# Altium footprint library Vowstar_Basic_Device.PcbLib: 170 footprints (part 4 of 11)
Each footprint in its own frame and in the unit in brackets; x right, y up, seen from the top. Pads: shape width x height; smd on the part's side, far side on the other; paste and mask are expansions set on the pad; w line width, h text height; cw(c..) or ccw(c..) is an arc to the next point about the centre after c.
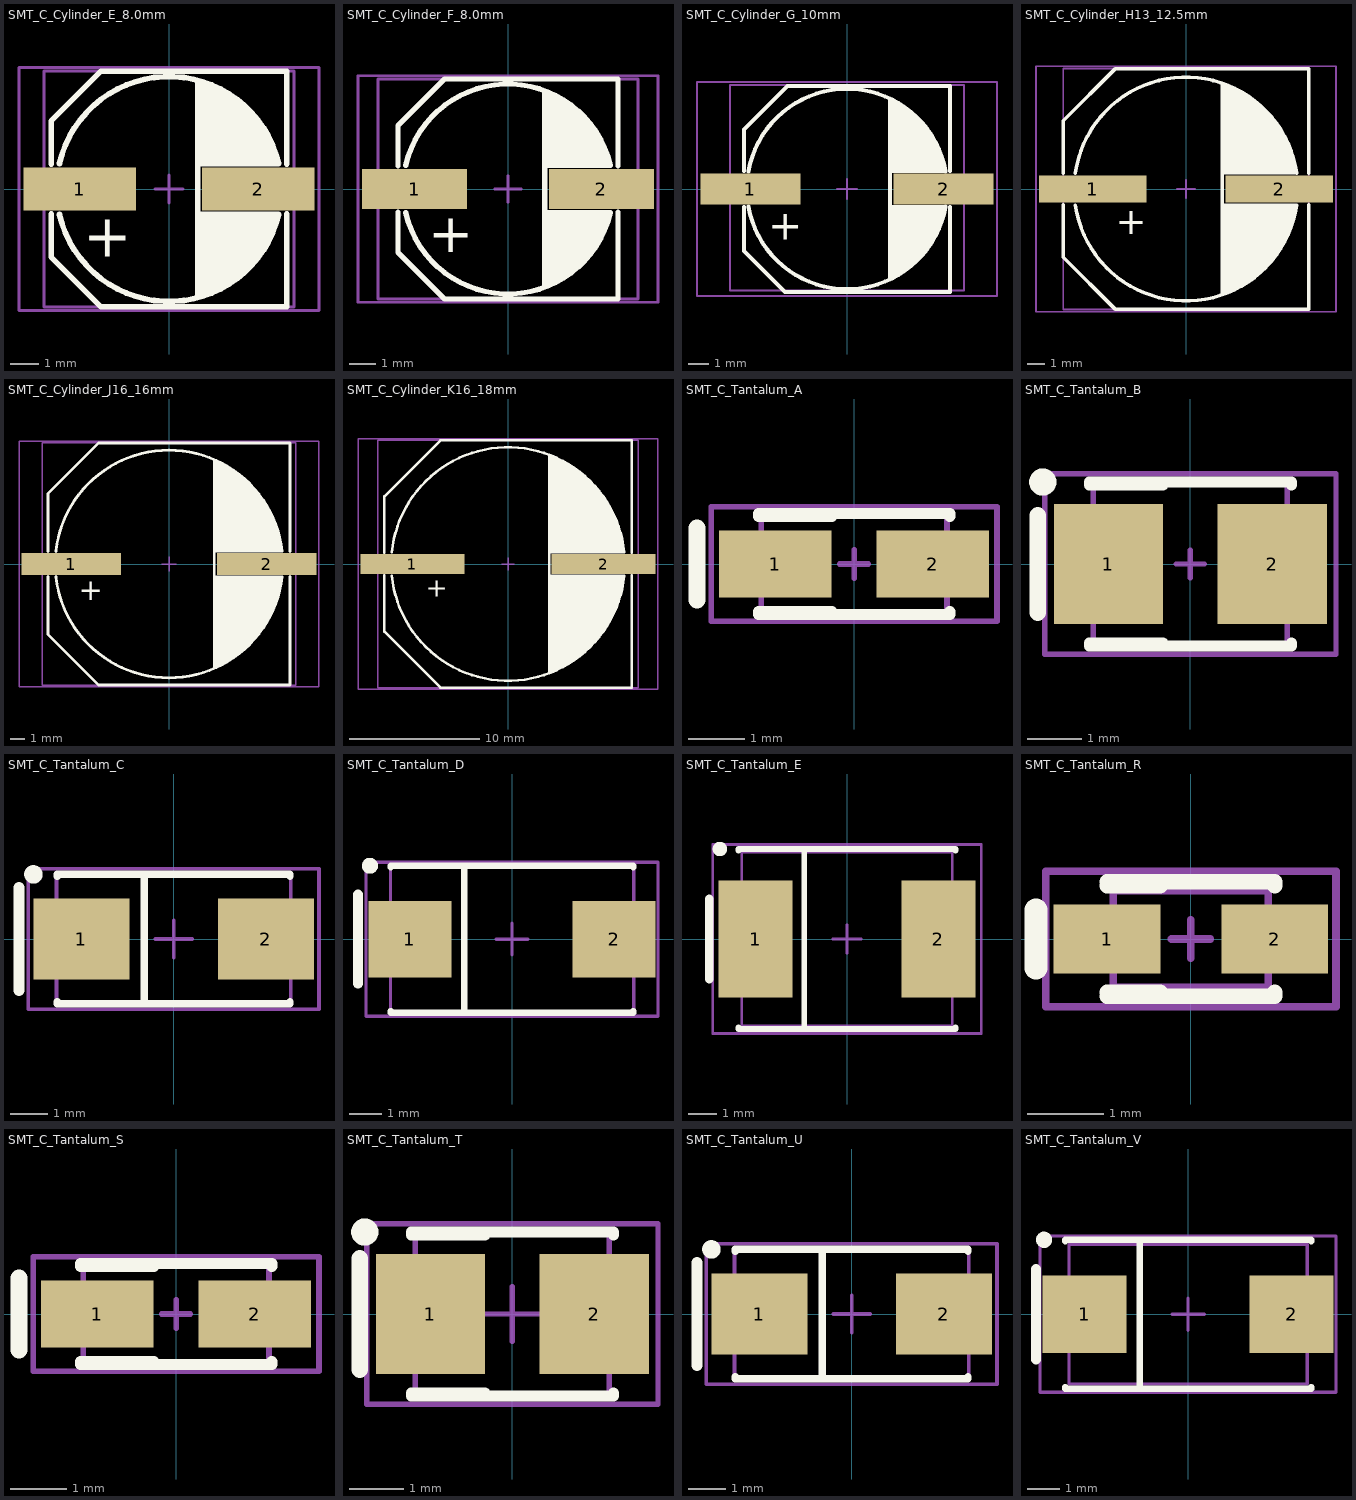
[diagram p3: the footprints below, top view; thin cyan lines are the x and y axes]

## SMT_C_Cylinder_E_8.0mm [mm] "Surface mount cylindrical capacitor type E 8.0mm"
height 6.2
pads (2):
  rect 4x1.524 smd: 1(-3.175,0) 2(3.175,0)
Top Overlay:
  region: 1.016,-0.813 3.912,-0.813 3.632,-1.702 2.921,-2.718 2.032,-3.454 1.194,-3.785 1.016,-3.81
  region: 1.016,0.813 3.912,0.813 3.632,1.702 2.921,2.718 2.032,3.454 1.194,3.785 1.016,3.81
  lines w0.2: -4.191,-0.889 -4.191,-2.413 -2.413,-4.191 4.191,-4.191 4.191,-0.889 ; -4.191,0.889 -4.191,2.413 -2.413,4.191 4.191,4.191 4.191,0.889 ; -3.895,-0.909 ccw(c0,0) 3.895,-0.909 ; -3.895,0.909 cw(c0,0) 3.895,0.909 ; 1.016,-3.81 1.016,3.81
  text "+" at -3.048,-2.413 h1.5
Mechanical 13:
  lines w0.1: -4.445,-4.191 4.445,-4.191 4.445,4.191 -4.445,4.191 -4.445,-4.191
Mechanical 15:
  lines w0.1: -0.5,0 0.5,0 ; 0,-0.5 0,0.5 ; -5.334,-4.318 5.334,-4.318 5.334,4.318 -5.334,4.318 -5.334,-4.318
3D body "User Library-capacitor size E.step": height 6.2, standoff -0.01, extent -4.5,-4.15 4.5,4.15

## SMT_C_Cylinder_F_8.0mm [mil] "Surface mount cylindrical capacitor type F 8.0mm"
height 401.57
pads (2):
  rect 157.48x60 smd: 1(-140,0) 2(140,0)
Top Overlay:
  region: 55,32 154,32 143,67 115,107 80,136 65,144 55,148
  region: 55,-32 154,-32 143,-67 115,-107 80,-136 65,-144 55,-147
  lines w7.87: -165,-35 -165,-95 -95,-165 165,-165 165,-35 ; -165,35 -165,95 -95,165 165,165 165,35 ; -153.36,-35.78 ccw(c0,0) 153.36,-35.78 ; -153.36,35.78 cw(c0,0) 153.36,35.78 ; 55,-145 55,145
  text "+" at -120,-95 h59.06
Mechanical 13:
  lines w3.94: -195,-165 -195,165 195,165 195,-165 -195,-165
Mechanical 15:
  lines w3.94: -19.69,0 19.68,0 ; 0,-19.68 0,19.69 ; -225,-170 225,-170 225,170 -225,170 -225,-170
3D body "User Library-capacitor size F.step": height 401.77, standoff -0.2, extent -194.88,-163.38 194.89,163.39

## SMT_C_Cylinder_G_10mm [mil] "Surface mount cylindrical capacitor type G 10mm"
height 401.57
pads (2):
  rect 196.85x60 smd: 1(-190,0) 2(190,0)
Top Overlay:
  region: 84.5,-32 193.5,-32 187.5,-61 169.5,-99 148.5,-129 116.5,-159 90.5,-175 84.5,-176
  region: 85,32 194,32 188,61 170,99 149,129 117,159 91,175 85,176
  lines w7.87: -202.99,-35 -202.99,-122.01 -122.01,-202.99 202.99,-202.99 202.99,-35 ; -202.99,35 -202.99,117.01 -117,203 202.99,203 202.99,35 ; -193.75,-34.78 ccw(c0,0) 193.75,-34.78 ; -193.75,34.78 cw(c0,0) 193.75,34.78 ; 85,-175 85,175
  text "+" at -155,-100 h59.06
Mechanical 13:
  lines w3.94: -230,-200 230,-200 230,205 -230,205 -230,-200
Mechanical 15:
  lines w3.94: -19.69,0 19.68,0 ; 0,-19.68 0,19.69 ; -295,-210 295,-210 295,210 -295,210 -295,-210
3D body "User Library-capacitor size G.step": height 401.77, standoff -0.2, extent -228.34,-202.75 228.35,202.76

## SMT_C_Cylinder_H13_12.5mm [mil] "Surface mount cylindrical capacitor type H 12.5mm"
height 543.31
pads (2):
  rect 236.22x60 smd: 1(-205,0) 2(205,0)
Top Overlay:
  region: 80.5,32 243.5,32 243.5,40 234.5,78 219.5,112 193.5,153 162.5,186 116.5,218 90.5,230 80.5,231
  region: 80,-32 243,-32 243,-40 234,-78 219,-112 193,-153 162,-186 116,-218 90,-230 80,-231
  lines w7.87: -270,-35 -270,-150 -155,-265 270,-265 270,-35 ; -270,35 -270,150 -155,265 270,265 270,35 ; -243.59,34.8 cw(c0,0) 243.59,34.8 ; -243.49,-35.51 ccw(c0,0) 243.49,-35.51 ; 80,-230 80,230
  text "+" at -155,-100 h59.06
Mechanical 13:
  lines w3.94: -270,-265 -270,265 270,265 270,-265 -270,-265
Mechanical 15:
  lines w3.94: -19.69,0 19.68,0 ; 0,-19.68 0,19.69 ; -330,-270 -330,270 330,270 330,-270 -330,-270
3D body "User Library-capacitor size H13.step": height 531.69, standoff -0.2, extent -271.65,-265.75 271.66,265.75

## SMT_C_Cylinder_J16_16mm [mil] "Surface mount cylindrical capacitor type J16 16mm"
height 661.42
pads (2):
  rect 275.59x60 smd: 1(-270,0) 2(270,0)
Top Overlay:
  region: 125,-32 313,-32 310,-53 296,-108 278,-150 249,-192 219,-225 181,-257 154,-274 125,-287
  region: 125,32 313,32 310,53 296,108 278,150 249,192 219,225 181,257 154,274 125,287
  lines w7.87: -335,-35 -335,-195 -195,-335 335,-335 335,-35 ; -335,35 -335,195 -195,335 335,335 335,35 ; -313.03,-34.78 ccw(c0,0) 312.97,-35.34 ; -313.03,34.78 cw(c0,0) 312.97,35.34 ; 125,-285 125,285
  text "+" at -250,-100 h59.06
Mechanical 13:
  lines w3.94: -350,-335 -350,335 350,335 350,-335 -350,-335
Mechanical 15:
  lines w3.94: -19.69,0 19.68,0 ; 0,-19.68 0,19.69 ; -415,-340 415,-340 415,340 -415,340 -415,-340
3D body "User Library-capacitor size J16.step": height 649.8, standoff -0.2, extent -348.42,-334.65 348.43,334.64

## SMT_C_Cylinder_K16_18mm [mil] "Surface mount cylindrical capacitor type K16 18mm"
height 661.42
pads (2):
  rect 314.96x60 smd: 1(-290,0) 2(290,0)
Top Overlay:
  region: 125,33 353,33 351,51 342,95 318,157 294,199 259,241 233,267 201,292 172,310 147,322 125,331
  region: 125,-33 353,-33 351,-51 342,-95 318,-157 294,-199 259,-241 233,-267 201,-292 172,-310 147,-322 125,-331
  lines w7.87: -375,-35 -375,-205 -205,-375 375,-375 375,-35 ; -375,35 -375,205 -205,375 375,375 375,35 ; -352.57,-35.26 ccw(c0,0) 352.57,-35.26 ; -352.57,35.26 cw(c0,0) 352.57,35.26 ; 125,-330 125,330
  text "+" at -250,-100 h59.06
Mechanical 13:
  lines w3.94: -395,-375 395,-375 395,375 -395,375 -395,-375
Mechanical 15:
  lines w3.94: -19.69,0 19.68,0 ; 0,-19.68 0,19.69 ; -455,-380 455,-380 455,380 -455,380 -455,-380
3D body "User Library-capacitor size K16.step": height 649.8, standoff -0.2, extent -395.66,-374.02 395.68,374.02

## SMT_C_Tantalum_A [mm] "Capacitor, SM Tantalum; Body 3.2 x 1.6 mm (LxW typ)"
height 1.8
pads (2):
  rect 2x1.2 smd: 1(-1.4,0) 2(1.4,0)
Top Overlay:
  lines w0.2: -1.7,-0.9 1.7,-0.9 1.7,-0.85 ; -1.7,-0.85 -0.4,-0.85 ; -1.7,0.85 -0.4,0.85 ; -1.7,0.9 1.7,0.9 1.7,0.85
  lines w0.305: -2.794,-0.635 -2.794,0.635
Mechanical 13:
  lines w0.1: -1.651,-0.889 1.651,-0.889 1.651,0.889 -1.651,0.889 -1.651,-0.889
Mechanical 15:
  lines w0.1: -0.254,0 0.254,0 ; 0,-0.254 0,0.254 ; -2.54,-1.016 -2.54,1.016 2.54,1.016 2.54,-1.016 -2.54,-1.016
3D body "User Library-Cap-Tantalum-Case-A-3216-18.step": height 1.6, standoff 0, extent -1.6,-0.8 1.6,0.8

## SMT_C_Tantalum_B [mm] "Capacitor, SM Tantalum; Body 3.5 x 2.8 mm (LxW typ)"
height 2.1
pads (2):
  rect 2x2.2 smd: 1(-1.5,0) 2(1.5,0)
Top Overlay:
  circle w0.25: c-2.7,1.5 r0.125
  lines w0.2: -1.85,-1.5 1.85,-1.5 1.85,-1.45 ; -1.85,-1.45 -0.5,-1.45 ; -1.85,1.45 -0.5,1.45 ; -1.85,1.5 1.85,1.5 1.85,1.45
  lines w0.305: -2.794,-0.889 -2.794,0.889
Mechanical 13:
  lines w0.1: -1.778,-1.524 1.778,-1.524 1.778,1.524 -1.778,1.524 -1.778,-1.524
Mechanical 15:
  lines w0.1: -0.254,0 0.254,0 ; 0,-0.254 0,0.254 ; -2.667,-1.651 -2.667,1.651 2.667,1.651 2.667,-1.651 -2.667,-1.651
3D body "User Library-Cap-Tantalum-Case-B-3528-21.step": height 1.9, standoff 0, extent -1.75,-1.403 1.75,1.397

## SMT_C_Tantalum_C [mm] "Capacitor, SM Tantalum; Body 6.0 x 3.2 mm (LxW typ)"
height 2.8
pads (2):
  rect 2.6x2.2 smd: 1(-2.5,0) 2(2.5,0)
Top Overlay:
  circle w0.25: c-3.8,1.75 r0.125
  lines w0.2: -3.15,-1.7 -3.15,-1.75 3.15,-1.75 3.15,-1.7 ; -3.15,1.7 -3.15,1.75 3.15,1.75 3.15,1.7 ; -0.8,-1.75 -0.8,1.75
  lines w0.305: -4.191,-1.397 -4.191,1.397
Mechanical 13:
  lines w0.1: -3.175,-1.778 3.175,-1.778 3.175,1.778 -3.175,1.778 -3.175,-1.778
Mechanical 15:
  lines w0.1: -0.5,0 0.5,0 ; 0,-0.5 0,0.5 ; -3.937,-1.905 -3.937,1.905 3.937,1.905 3.937,-1.905 -3.937,-1.905
3D body "User Library-Cap-Tantalum-6032-28 C-CASE.step": height 2.8, standoff 0, extent -3.15,-1.747 3.15,1.753

## SMT_C_Tantalum_D [mm] "Capacitor, SM Tantalum; Body 7.3 x 4.3 mm (LxW typ)"
height 3.1
pads (2):
  rect 2.6x2.4 smd: 1(-3.2,0) 2(3.2,0)
Top Overlay:
  circle w0.25: c-4.45,2.3 r0.125
  lines w0.2: -3.8,-2.25 -3.8,-2.3 3.8,-2.3 3.8,-2.25 ; -3.8,2.25 -3.8,2.3 3.8,2.3 3.8,2.25 ; -1.5,-2.3 -1.5,2.3
  lines w0.305: -4.826,-1.397 -4.826,1.397
Mechanical 13:
  lines w0.1: -3.81,-2.286 3.81,-2.286 3.81,2.286 -3.81,2.286 -3.81,-2.286
Mechanical 15:
  lines w0.1: -0.5,0 0.5,0 ; 0,-0.5 0,0.5 ; -4.572,-2.413 -4.572,2.413 4.572,2.413 4.572,-2.413 -4.572,-2.413
3D body "User Library-Cap-Tantalum 7343-31 D-CASE.step": height 3.1, standoff 0, extent -3.81,-2.286 3.79,2.314

## SMT_C_Tantalum_E [mm] "Capacitor, SM Tantalum; Body 7.3 x 6.0 mm (LxW typ)"
height 3.8
pads (2):
  rect 2.6x4.1 smd: 1(-3.2,0) 2(3.2,0)
Top Overlay:
  circle w0.25: c-4.45,3.15 r0.125
  lines w0.2: -3.8,-3.1 -3.8,-3.15 3.8,-3.15 3.8,-3.1 ; -3.8,3.1 -3.8,3.15 3.8,3.15 3.8,3.1 ; -1.5,-3.15 -1.5,3.15
  lines w0.305: -4.826,-1.397 -4.826,1.397
Mechanical 13:
  lines w0.1: -3.683,-3.048 -3.683,3.048 3.683,3.048 3.683,-3.048 -3.683,-3.048
Mechanical 15:
  lines w0.1: -0.5,0 0.5,0 ; 0,-0.5 0,0.5 ; -4.699,-3.302 4.699,-3.302 4.699,3.302 -4.699,3.302 -4.699,-3.302
3D body "User Library-Cap-Tantalum-Case-E-7260-38.step": height 3.6, standoff 0, extent -3.658,-2.997 3.642,3.003

## SMT_C_Tantalum_R [mm] "Capacitor, SM Tantalum; Body 2.0 x 1.3 mm (LxW typ)"
height 1.2
pads (2):
  rect 1.4x0.9 smd: 1(-1.1,0) 2(1.1,0)
Top Overlay:
  lines w0.2: -1.1,-0.75 1.1,-0.75 1.1,-0.7 ; -1.1,-0.7 -0.4,-0.7 ; -1.1,0.7 -0.4,0.7 ; -1.1,0.75 1.1,0.75 1.1,0.7
  lines w0.305: -2.032,-0.381 -2.032,0.381
Mechanical 13:
  lines w0.1: -1.016,-0.635 1.016,-0.635 1.016,0.635 -1.016,0.635 -1.016,-0.635
Mechanical 15:
  lines w0.1: -0.254,0 0.254,0 ; 0,-0.254 0,0.254 ; -1.905,-0.889 -1.905,0.889 1.905,0.889 1.905,-0.889 -1.905,-0.889
3D body "User Library-Cap-Tantalum-Case-R-2012-12.step": height 1.2, standoff 0, extent -1.003,-0.647 0.997,0.653

## SMT_C_Tantalum_S [mm] "Capacitor, SM Tantalum; Body 3.2 x 1.6 mm (LxW typ)"
height 1.2
pads (2):
  rect 2x1.2 smd: 1(-1.4,0) 2(1.4,0)
Top Overlay:
  lines w0.2: -1.7,-0.9 1.7,-0.9 1.7,-0.85 ; -1.7,-0.85 -0.4,-0.85 ; -1.7,0.85 -0.4,0.85 ; -1.7,0.9 1.7,0.9 1.7,0.85
  lines w0.305: -2.794,-0.635 -2.794,0.635
Mechanical 13:
  lines w0.1: -1.651,-0.889 -1.651,0.889 1.651,0.889 1.651,-0.889 -1.651,-0.889
Mechanical 15:
  lines w0.1: -0.254,0 0.254,0 ; 0,-0.254 0,0.254 ; -2.54,-1.016 2.54,-1.016 2.54,1.016 -2.54,1.016 -2.54,-1.016

## SMT_C_Tantalum_T [mm] "Capacitor, SM Tantalum; Body 3.5 x 2.8 mm (LxW typ)"
height 1.2
pads (2):
  rect 2x2.2 smd: 1(-1.5,0) 2(1.5,0)
Top Overlay:
  circle w0.25: c-2.7,1.5 r0.125
  lines w0.2: -1.85,-1.5 1.85,-1.5 1.85,-1.45 ; -1.85,-1.45 -0.5,-1.45 ; -1.85,1.45 -0.5,1.45 ; -1.85,1.5 1.85,1.5 1.85,1.45
  lines w0.305: -2.794,-1.016 -2.794,1.016
Mechanical 13:
  lines w0.1: -1.778,-1.524 1.778,-1.524 1.778,1.524 -1.778,1.524 -1.778,-1.524
Mechanical 15:
  lines w0.1: -0.5,0 0.5,0 ; 0,-0.5 0,0.5 ; -2.667,-1.651 -2.667,1.651 2.667,1.651 2.667,-1.651 -2.667,-1.651

## SMT_C_Tantalum_U [mm] "Capacitor, SM Tantalum; Body 6.0 x 3.2 mm (LxW typ)"
height 1.5
pads (2):
  rect 2.6x2.2 smd: 1(-2.5,0) 2(2.5,0)
Top Overlay:
  circle w0.25: c-3.8,1.75 r0.125
  lines w0.2: -3.15,-1.7 -3.15,-1.75 3.15,-1.75 3.15,-1.7 ; -3.15,1.7 -3.15,1.75 3.15,1.75 3.15,1.7 ; -0.8,-1.75 -0.8,1.75
  lines w0.305: -4.191,-1.397 -4.191,1.397
Mechanical 13:
  lines w0.1: -3.175,-1.778 3.175,-1.778 3.175,1.778 -3.175,1.778 -3.175,-1.778
Mechanical 15:
  lines w0.1: -0.5,0 0.5,0 ; 0,-0.5 0,0.5 ; -3.937,-1.905 -3.937,1.905 3.937,1.905 3.937,-1.905 -3.937,-1.905

## SMT_C_Tantalum_V [mm] "Capacitor, SM Tantalum; Body 7.3 x 4.3 mm (LxW typ)"
height 2
pads (2):
  rect 2.6x2.4 smd: 1(-3.2,0) 2(3.2,0)
Top Overlay:
  circle w0.25: c-4.45,2.3 r0.125
  lines w0.2: -3.8,-2.25 -3.8,-2.3 3.8,-2.3 3.8,-2.25 ; -3.8,2.25 -3.8,2.3 3.8,2.3 3.8,2.25 ; -1.5,-2.3 -1.5,2.3
  lines w0.305: -4.699,-1.397 -4.699,1.397
Mechanical 13:
  lines w0.1: -3.683,-2.159 -3.683,2.159 3.683,2.159 3.683,-2.159 -3.683,-2.159
Mechanical 15:
  lines w0.1: -0.5,0 0.5,0 ; 0,-0.5 0,0.5 ; -4.572,-2.413 4.572,-2.413 4.572,2.413 -4.572,2.413 -4.572,-2.413
3D body "User Library-Cap-Tantalum-Case-V-7343-20.step": height 2, standoff 0, extent -3.658,-2.159 3.642,2.141